# Altium schematic symbol library IC_TI.SCHLIB: 1162 symbols (part 6 of 8) (continued)
## SN74LVC245ADWR (continued)
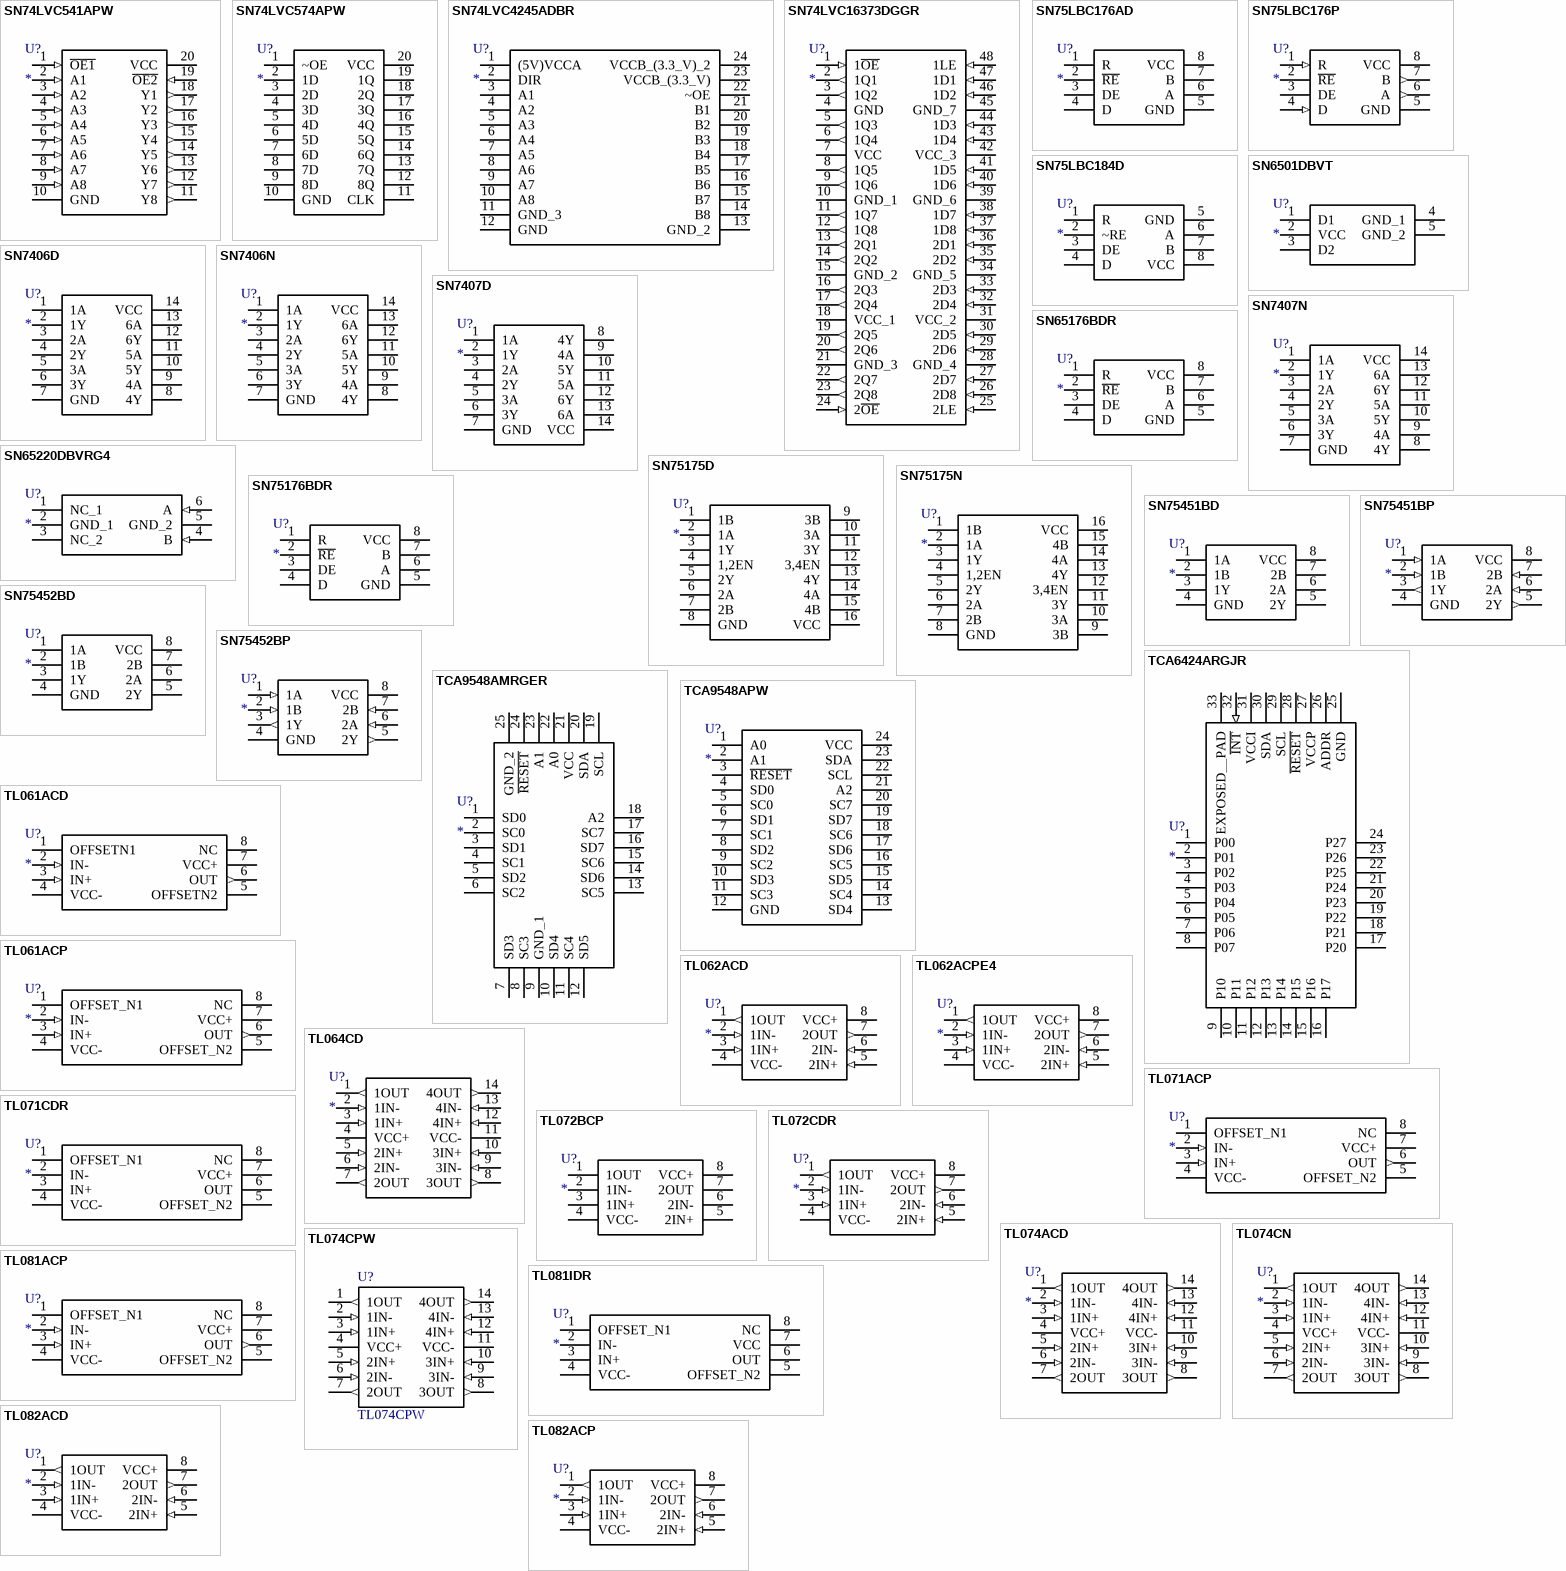
[diagram p25: symbols SN74LVC541APW to TL082ACP]

## SN74LVC541APW
designator U?
Integrated Circuit; Manufacturer_Name: Texas Instruments; Manufacturer_Part_Number: SN74LVC541APW; Datasheet Link: http://www.ti.com/lit/ds/symlink/sn74lvc541a.pdf; Height: 1.2mm; Mouser Part Number: 595-SN74LVC541APW; Mouser Price/Stock: https://www.mouser.com/Search/Refine.aspx?Keyword=595-SN74LVC541APW; RS Part Number: 1791611; RS Price/Stock: http://uk.rs-online.com/web/p/products/1791611
footprint TSSOP20_0.65 (TSOP, 20-Leads, Body 6.6x4.5mm (max), Pitch 0.65mm, IPC Medium Density)
pins: 1 ~{OE1} (in), 2 A1 (in), 3 A2 (in), 4 A3 (in), 5 A4 (in), 6 A5 (in), 7 A6 (in), 8 A7 (in), 9 A8 (in), 10 GND (power), 11 Y8 (out), 12 Y7 (out), 13 Y6 (out), 14 Y5 (out), 15 Y4 (out), 16 Y3 (out), 17 Y2 (out), 18 Y1 (out), 19 ~{OE2} (in), 20 VCC (power)

## SN74LVC574APW
designator U?
Integrated Circuit; Manufacturer_Name: Texas Instruments; Manufacturer_Part_Number: SN74LVC574APW; Mouser Part Number: 595-SN74LVC574APW; Mouser Price/Stock: https://www.mouser.com/Search/Refine.aspx?Keyword=595-SN74LVC574APW
footprint TSSOP20_0.65 (TSOP, 20-Leads, Body 6.6x4.5mm (max), Pitch 0.65mm, IPC Medium Density)
pins: 1 ~OE, 2 1D, 3 2D, 4 3D, 5 4D, 6 5D, 7 6D, 8 7D, 9 8D, 10 GND, 11 CLK, 12 8Q, 13 7Q, 14 6Q, 15 5Q, 16 4Q, 17 3Q, 18 2Q, 19 1Q, 20 VCC

## SN74LVC4245ADBR
designator U?
Integrated Circuit; Manufacturer_Name: Texas Instruments; Manufacturer_Part_Number: SN74LVC4245ADBR; Datasheet Link: http://www.ti.com/lit/gpn/sn74lvc4245a; Mouser Part Number: 595-SN74LVC4245ADBR; Mouser Price/Stock: https://www.mouser.com/Search/Refine.aspx?Keyword=595-SN74LVC4245ADBR; RS Part Number: 1627513; RS Price/Stock: http://uk.rs-online.com/web/p/products/1627513
footprint TSSOP24W_0.65 (TSOP, 24-Leads, Body 7.80x4.40mm, Pitch 0.65mm, Thermal Pad 5.16x2.40mm, IPC Low Density)
pins: 1 (5V)VCCA, 2 DIR, 3 A1, 4 A2, 5 A3, 6 A4, 7 A5, 8 A6, 9 A7, 10 A8, 11 GND_3, 12 GND, 13 GND_2, 14 B8, 15 B7, 16 B6, 17 B5, 18 B4, 19 B3, 20 B2, 21 B1, 22 ~OE, 23 VCCB_(3.3_V), 24 VCCB_(3.3_V)_2

## SN74LVC16373DGGR
designator U?
Integrated Circuit; Manufacturer_Name: Texas Instruments; Manufacturer_Part_Number: SN74LVC16373DGGR; Datasheet Link: http://www.ti.com/lit/ds/symlink/sn74lvc16373.pdf; Height: 1.2mm; Mouser Part Number: 595-SN74LVC16373DGGR; RS Part Number: 6628667; RS Price/Stock: http://uk.rs-online.com/web/p/products/6628667
footprint SSOP48_0.65
pins: 1 1~{OE} (in), 2 1Q1 (out), 3 1Q2 (out), 4 GND (power), 5 1Q3 (out), 6 1Q4 (out), 7 VCC (power), 8 1Q5 (out), 9 1Q6 (out), 10 GND_1 (power), 11 1Q7 (out), 12 1Q8 (out), 13 2Q1 (out), 14 2Q2 (out), 15 GND_2 (power), 16 2Q3 (out), 17 2Q4 (out), 18 VCC_1 (power), 19 2Q5 (out), 20 2Q6 (out), 21 GND_3 (power), 22 2Q7 (out), 23 2Q8 (out), 24 2~{OE} (in), 25 2LE (in), 26 2D8 (in), 27 2D7 (in), 28 GND_4 (power), 29 2D6 (in), 30 2D5 (in), 31 VCC_2 (power), 32 2D4 (in), 33 2D3 (in), 34 GND_5 (power), 35 2D2 (in), 36 2D1 (in), 37 1D8 (in), 38 1D7 (in), 39 GND_6 (power), 40 1D6 (in), 41 1D5 (in), 42 VCC_3 (power), 43 1D4 (in), 44 1D3 (in), 45 GND_7 (power), 46 1D2 (in), 47 1D1 (in), 48 1LE (in)

## SN75LBC176AD
designator U?
Integrated Circuit; Manufacturer_Name: Texas Instruments; Manufacturer_Part_Number: SN75LBC176AD; Datasheet Link: http://www.ti.com/lit/ds/symlink/sn75lbc176a.pdf; Height: 1.75mm; Mouser Part Number: 595-SN75LBC176AD; Mouser Price/Stock: https://www.mouser.com/Search/Refine.aspx?Keyword=595-SN75LBC176AD; RS Part Number: 1218658; RS Price/Stock: http://uk.rs-online.com/web/p/products/1218658
footprint SOIC8_1.27 (SOP, 8-Leads, Pitch 1.27mm)
pins: 1 R, 2 ~{RE}, 3 DE, 4 D, 5 GND (power), 6 A, 7 B, 8 VCC (power)

## SN75LBC176P
designator U?
Integrated Circuit; Manufacturer_Name: Texas Instruments; Manufacturer_Part_Number: SN75LBC176P; Datasheet Link: http://www.ti.com/lit/ds/symlink/sn75lbc176.pdf; Height: 5.08mm; Mouser Part Number: 595-SN75LBC176P; Mouser Price/Stock: https://www.mouser.com/Search/Refine.aspx?Keyword=595-SN75LBC176P; RS Part Number: 1892333P; RS Price/Stock: http://uk.rs-online.com/web/p/products/1892333P
footprint DIP8-A
pins: 1 R (in), 2 ~{RE}, 3 DE, 4 D (in), 5 GND (power), 6 A (out), 7 B (out), 8 VCC (power)

## SN75LBC184D
designator U?
Integrated Circuit; Manufacturer_Name: Texas Instruments; Manufacturer_Part_Number: SN75LBC184D; Datasheet Link: http://www.ti.com/lit/gpn/sn75lbc184; Mouser Part Number: 595-SN75LBC184D; Mouser Price/Stock: https://www.mouser.com/Search/Refine.aspx?Keyword=595-SN75LBC184D; RS Part Number: 1218420; RS Price/Stock: http://uk.rs-online.com/web/p/products/1218420
footprint SOIC8_1.27 (SOP, 8-Leads, Pitch 1.27mm)
pins: 1 R, 2 ~RE, 3 DE, 4 D, 5 GND, 6 A, 7 B, 8 VCC

## SN6501DBVT
designator U?
Integrated Circuit; Manufacturer_Name: Texas Instruments; Manufacturer_Part_Number: SN6501DBVT; Datasheet Link: http://www.ti.com/lit/gpn/sn6501; Height: 1.45mm; Mouser Part Number: 595-SN6501DBVT; Mouser Price/Stock: https://www.mouser.com/Search/Refine.aspx?Keyword=595-SN6501DBVT; RS Part Number: 9222313; RS Price/Stock: http://uk.rs-online.com/web/p/products/9222313
footprint SOT23-5 (SOT23, 5-Leads, Body 3.0x3.0mm (max), Pitch 0.95mm, IPC Medium Density)
pins: 1 D1, 2 VCC, 3 D2, 4 GND_1, 5 GND_2

## SN7406D
designator U?
Integrated Circuit; Manufacturer_Name: Texas Instruments; Manufacturer_Part_Number: SN7406D; Datasheet Link: http://www.ti.com/lit/ds/symlink/sn7406.pdf; Height: 1.75mm; Mouser Part Number: 595-SN7406D; Mouser Price/Stock: https://www.mouser.com/Search/Refine.aspx?Keyword=595-SN7406D; RS Part Number: 6630739P; RS Price/Stock: http://uk.rs-online.com/web/p/products/6630739P
footprint SOIC14_1.27
pins: 1 1A, 2 1Y, 3 2A, 4 2Y, 5 3A, 6 3Y, 7 GND (power), 8 4Y, 9 4A, 10 5Y, 11 5A, 12 6Y, 13 6A, 14 VCC (power)

## SN7406N
designator U?
Integrated Circuit; Manufacturer_Name: Texas Instruments; Manufacturer_Part_Number: SN7406N; Datasheet Link: http://www.ti.com/lit/gpn/sn7406; Mouser Part Number: 595-SN7406N; Mouser Price/Stock: https://www.mouser.com/Search/Refine.aspx?Keyword=595-SN7406N; RS Part Number: 0306320P; RS Price/Stock: http://uk.rs-online.com/web/p/products/0306320P
footprint DIP14
pins: 1 1A, 2 1Y, 3 2A, 4 2Y, 5 3A, 6 3Y, 7 GND, 8 4Y, 9 4A, 10 5Y, 11 5A, 12 6Y, 13 6A, 14 VCC

## SN7407D
designator U?
Integrated Circuit; Manufacturer_Name: Texas Instruments; Manufacturer_Part_Number: SN7407D; Datasheet Link: http://componentsearchengine.com/Datasheets/1/SN7407D.pdf; Mouser Part Number: 595-SN7407D; Mouser Price/Stock: https://www.mouser.com/Search/Refine.aspx?Keyword=595-SN7407D; RS Part Number: 2508243277; RS Price/Stock: http://uk.rs-online.com/web/p/products/2508243277
footprint SOIC14_1.27
pins: 1 1A, 2 1Y, 3 2A, 4 2Y, 5 3A, 6 3Y, 7 GND, 8 4Y, 9 4A, 10 5Y, 11 5A, 12 6Y, 13 6A, 14 VCC

## SN7407N
designator U?
Integrated Circuit; Manufacturer_Name: Texas Instruments; Manufacturer_Part_Number: SN7407N; Datasheet Link: http://www.ti.com/lit/gpn/sn7407; Mouser Part Number: 595-SN7407N; Mouser Price/Stock: https://www.mouser.com/Search/Refine.aspx?Keyword=595-SN7407N; RS Part Number: 3685610; RS Price/Stock: http://uk.rs-online.com/web/p/products/3685610
footprint DIP14
pins: 1 1A, 2 1Y, 3 2A, 4 2Y, 5 3A, 6 3Y, 7 GND, 8 4Y, 9 4A, 10 5Y, 11 5A, 12 6Y, 13 6A, 14 VCC

## SN65176BDR
designator U?
Integrated Circuit; Manufacturer_Name: Texas Instruments; Manufacturer_Part_Number: SN65176BDR; Datasheet Link: http://www.ti.com/lit/ds/symlink/sn65176b.pdf; Height: 1.75mm; Mouser Part Number: 595-SN65176BDR; Mouser Price/Stock: https://www.mouser.com/Search/Refine.aspx?Keyword=595-SN65176BDR; RS Part Number: 0528539; RS Price/Stock: http://uk.rs-online.com/web/p/products/0528539
footprint SOIC8_1.27 (SOP, 8-Leads, Pitch 1.27mm)
pins: 1 R, 2 ~{RE}, 3 DE, 4 D, 5 GND (power), 6 A, 7 B, 8 VCC (power)

## SN65220DBVRG4
designator U?
Integrated Circuit; Manufacturer_Name: Texas Instruments; Manufacturer_Part_Number: SN65220DBVRG4; Datasheet Link: http://www.ti.com/lit/ds/symlink/sn75240.pdf; Height: 1.45mm; Mouser Part Number: 595-SN65220DBVRG4; Mouser Price/Stock: https://www.mouser.com/Search/Refine.aspx?Keyword=595-SN65220DBVRG4
footprint SOT23-6
pins: 1 NC_1, 2 GND_1 (power), 3 NC_2, 4 B (in), 5 GND_2 (power), 6 A (in)

## SN75175D
designator U?
Integrated Circuit; Manufacturer_Name: Texas Instruments; Manufacturer_Part_Number: SN75175D; Datasheet Link: http://www.ti.com/lit/gpn/sn75175; Mouser Part Number: 595-SN75175D; Mouser Price/Stock: https://www.mouser.com/Search/Refine.aspx?Keyword=595-SN75175D; RS Part Number: 1451020; RS Price/Stock: http://uk.rs-online.com/web/p/products/1451020
footprint SOIC16_1.27
pins: 1 1B, 2 1A, 3 1Y, 4 1,2EN, 5 2Y, 6 2A, 7 2B, 8 GND, 9 3B, 10 3A, 11 3Y, 12 3,4EN, 13 4Y, 14 4A, 15 4B, 16 VCC

## SN75175N
designator U?
Integrated Circuit; Manufacturer_Name: Texas Instruments; Manufacturer_Part_Number: SN75175N; Datasheet Link: http://www.ti.com/lit/gpn/sn75175; Mouser Part Number: 595-SN75175N; Mouser Price/Stock: https://www.mouser.com/Search/Refine.aspx?Keyword=595-SN75175N; RS Part Number: 0630904; RS Price/Stock: http://uk.rs-online.com/web/p/products/0630904
footprint DIP16
pins: 1 1B, 2 1A, 3 1Y, 4 1,2EN, 5 2Y, 6 2A, 7 2B, 8 GND, 9 3B, 10 3A, 11 3Y, 12 3,4EN, 13 4Y, 14 4A, 15 4B, 16 VCC

## SN75176BDR
designator U?
Integrated Circuit; Manufacturer_Name: Texas Instruments; Manufacturer_Part_Number: SN75176BDR; Datasheet Link: http://www.ti.com/lit/ds/symlink/sn75176b.pdf; Height: 1.75mm; Mouser Part Number: 595-SN75176BDR; Mouser Price/Stock: https://www.mouser.com/Search/Refine.aspx?Keyword=595-SN75176BDR; RS Part Number: 0526391; RS Price/Stock: http://uk.rs-online.com/web/p/products/0526391
footprint SOIC8_1.27 (SOP, 8-Leads, Pitch 1.27mm)
pins: 1 R, 2 ~{RE}, 3 DE, 4 D, 5 GND (power), 6 A, 7 B, 8 VCC (power)

## SN75451BD
designator U?
Integrated Circuit; Manufacturer_Name: Texas Instruments; Manufacturer_Part_Number: SN75451BD; Datasheet Link: http://www.ti.com/lit/ds/symlink/sn75451b.pdf; Height: 1.75mm; Mouser Part Number: 595-SN75451BD; Mouser Price/Stock: https://www.mouser.com/Search/Refine.aspx?Keyword=595-SN75451BD; RS Part Number: 0857783P; RS Price/Stock: http://uk.rs-online.com/web/p/products/0857783P
footprint SOIC8_1.27 (SOP, 8-Leads, Pitch 1.27mm)
pins: 1 1A, 2 1B, 3 1Y, 4 GND (power), 5 2Y, 6 2A, 7 2B, 8 VCC (power)

## SN75451BP
designator U?
Integrated Circuit; Manufacturer_Name: Texas Instruments; Manufacturer_Part_Number: SN75451BP; Datasheet Link: http://docs-emea.rs-online.com/webdocs/13d2/0900766b813d278b.pdf; Height: 5.08mm; Mouser Part Number: 595-SN75451BP; Mouser Price/Stock: https://www.mouser.com/Search/Refine.aspx?Keyword=595-SN75451BP; RS Part Number: 0649295; RS Price/Stock: http://uk.rs-online.com/web/p/products/0649295
footprint DIP8-A
pins: 1 1A (in), 2 1B (in), 3 1Y (out), 4 GND (power), 5 2Y (out), 6 2A (in), 7 2B (in), 8 VCC (power)

## SN75452BD
designator U?
Integrated Circuit; Manufacturer_Name: Texas Instruments; Manufacturer_Part_Number: SN75452BD; Datasheet Link: http://www.ti.com/lit/ds/symlink/sn75451b.pdf; Height: 1.75mm; Mouser Part Number: 595-SN75452BD; Mouser Price/Stock: https://www.mouser.com/Search/Refine.aspx?Keyword=595-SN75452BD; RS Part Number: 0857799; RS Price/Stock: http://uk.rs-online.com/web/p/products/0857799
footprint SOIC8_1.27 (SOP, 8-Leads, Pitch 1.27mm)
pins: 1 1A, 2 1B, 3 1Y, 4 GND (power), 5 2Y, 6 2A, 7 2B, 8 VCC (power)

## SN75452BP
designator U?
Integrated Circuit; Manufacturer_Name: Texas Instruments; Manufacturer_Part_Number: SN75452BP; Datasheet Link: http://docs-emea.rs-online.com/webdocs/13d2/0900766b813d278b.pdf; Height: 5.08mm; Mouser Part Number: 595-SN75452BP; Mouser Price/Stock: https://www.mouser.com/Search/Refine.aspx?Keyword=595-SN75452BP; RS Part Number: 1218457; RS Price/Stock: http://uk.rs-online.com/web/p/products/1218457
footprint DIP8-A
pins: 1 1A (in), 2 1B (in), 3 1Y (out), 4 GND (power), 5 2Y (out), 6 2A (in), 7 2B (in), 8 VCC (power)

## TCA6424ARGJR
designator U?
Integrated Circuit; Manufacturer_Name: Texas Instruments; Manufacturer_Part_Number: TCA6424ARGJR; Datasheet Link: http://www.ti.com/lit/ds/symlink/tca6424a.pdf; Height: 0.6mm; Mouser Part Number: 595-TCA6424ARGJR; Mouser Price/Stock: https://www.mouser.com/Search/Refine.aspx?Keyword=595-TCA6424ARGJR; RS Part Number: 1626407; RS Price/Stock: http://uk.rs-online.com/web/p/products/1626407
footprint QFN32_0.5-PAD(5X5) (QFN, 32-Leads, Body 5.2x5.2mm (max), Pitch 0.50mm, IPC Medium Density)
pins: 1 P00, 2 P01, 3 P02, 4 P03, 5 P04, 6 P05, 7 P06, 8 P07, 9 P10, 10 P11, 11 P12, 12 P13, 13 P14, 14 P15, 15 P16, 16 P17, 17 P20, 18 P21, 19 P22, 20 P23, 21 P24, 22 P25, 23 P26, 24 P27, 25 GND (power), 26 ADDR, 27 VCCP (power), 28 ~{RESET}, 29 SCL, 30 SDA, 31 VCCI (power), 32 ~{INT} (in), 33 EXPOSED__PAD

## TCA9548AMRGER
designator U?
Integrated Circuit; Manufacturer_Name: Texas Instruments; Manufacturer_Part_Number: TCA9548AMRGER; Datasheet Link: http://www.ti.com/lit/gpn/tca9548a; Height: 1mm; Mouser Part Number: 595-TCA9548AMRGER; Mouser Price/Stock: https://www.mouser.com/Search/Refine.aspx?Keyword=595-TCA9548AMRGER
footprint QFN24_0.5-PAD(4X4) (QFN, 24-Leads, Body 4.1x4.1mm (max), Pitch 0.50mm, IPC Medium Density)
pins: 1 SD0, 2 SC0, 3 SD1, 4 SC1, 5 SD2, 6 SC2, 7 SD3, 8 SC3, 9 GND_1 (power), 10 SD4, 11 SC4, 12 SD5, 13 SC5, 14 SD6, 15 SC6, 16 SD7, 17 SC7, 18 A2, 19 SCL, 20 SDA, 21 VCC (power), 22 A0, 23 A1, 24 ~{RESET}, 25 GND_2

## TCA9548APW
designator U?
Integrated Circuit; Manufacturer_Name: Texas Instruments; Manufacturer_Part_Number: TCA9548APW; Datasheet Link: http://www.ti.com/lit/ds/symlink/tca9548a.pdf; Height: 1.2mm
footprint TSSOP24_0.65 (TSOP, 24-Leads, Body 7.80x4.40mm, Pitch 0.65mm, Thermal Pad 5.16x2.40mm, IPC Low Density)
pins: 1 A0, 2 A1, 3 ~{RESET}, 4 SD0, 5 SC0, 6 SD1, 7 SC1, 8 SD2, 9 SC2, 10 SD3, 11 SC3, 12 GND, 13 SD4, 14 SC4, 15 SD5, 16 SC5, 17 SD6, 18 SC6, 19 SD7, 20 SC7, 21 A2, 22 SCL, 23 SDA, 24 VCC

## TL061ACD
designator U?
Integrated Circuit; Manufacturer_Name: Texas Instruments; Manufacturer_Part_Number: TL061ACD; Datasheet Link: http://www.ti.com/lit/ds/symlink/tl061a.pdf; Height: 1.75mm; Mouser Part Number: 595-TL061ACD; Mouser Price/Stock: https://www.mouser.com/Search/Refine.aspx?Keyword=595-TL061ACD; RS Part Number: 1450408; RS Price/Stock: http://uk.rs-online.com/web/p/products/1450408
footprint SOIC8_1.27 (SOP, 8-Leads, Pitch 1.27mm)
pins: 1 OFFSETN1, 2 IN- (in), 3 IN+ (in), 4 VCC- (power), 5 OFFSETN2, 6 OUT (out), 7 VCC+ (power), 8 NC

## TL061ACP
designator U?
Integrated Circuit; Manufacturer_Name: Texas Instruments; Manufacturer_Part_Number: TL061ACP; Datasheet Link: http://www.ti.com/lit/ds/symlink/tl061a.pdf; Height: 5.08mm; Mouser Part Number: 595-TL061ACP; Mouser Price/Stock: https://www.mouser.com/Search/Refine.aspx?Keyword=595-TL061ACP; RS Part Number: 1456107; RS Price/Stock: http://uk.rs-online.com/web/p/products/1456107
footprint DIP8-A
pins: 1 OFFSET_N1, 2 IN- (in), 3 IN+ (in), 4 VCC- (power), 5 OFFSET_N2, 6 OUT (out), 7 VCC+ (power), 8 NC

## TL062ACD
designator U?
Integrated Circuit; Manufacturer_Name: Texas Instruments; Manufacturer_Part_Number: TL062ACD; Datasheet Link: http://www.ti.com/lit/ds/symlink/tl061a.pdf; Height: 1.75mm; RS Part Number: 2508248351; RS Price/Stock: http://uk.rs-online.com/web/p/products/2508248351
footprint SOIC8_1.27 (SOP, 8-Leads, Pitch 1.27mm)
pins: 1 1OUT (out), 2 1IN- (in), 3 1IN+ (in), 4 VCC- (power), 5 2IN+ (in), 6 2IN- (in), 7 2OUT (out), 8 VCC+ (power)

## TL062ACPE4
designator U?
Integrated Circuit; Manufacturer_Name: Texas Instruments; Manufacturer_Part_Number: TL062ACPE4; Datasheet Link: http://www.ti.com/lit/ds/symlink/tl061a.pdf; Height: 5.08mm; RS Part Number: 7092176P; RS Price/Stock: http://uk.rs-online.com/web/p/products/7092176P
footprint DIP8-A
pins: 1 1OUT (out), 2 1IN- (in), 3 1IN+ (in), 4 VCC- (power), 5 2IN+ (in), 6 2IN- (in), 7 2OUT (out), 8 VCC+ (power)

## TL064CD
designator U?
Integrated Circuit; Manufacturer_Name: Texas Instruments; Manufacturer_Part_Number: TL064CD; Datasheet Link: http://www.ti.com/lit/ds/symlink/tl061.pdf; Height: 1.75mm; Mouser Part Number: 595-TL064CD; Mouser Price/Stock: https://www.mouser.com/Search/Refine.aspx?Keyword=595-TL064CD; RS Part Number: 0857884P; RS Price/Stock: http://uk.rs-online.com/web/p/products/0857884P
footprint SOIC14_1.27
pins: 1 1OUT (out), 2 1IN- (in), 3 1IN+ (in), 4 VCC+ (power), 5 2IN+ (in), 6 2IN- (in), 7 2OUT (out), 8 3OUT (out), 9 3IN- (in), 10 3IN+ (in), 11 VCC- (power), 12 4IN+ (in), 13 4IN- (in), 14 4OUT (out)

## TL071ACP
designator U?
Integrated Circuit; Manufacturer_Name: Texas Instruments; Manufacturer_Part_Number: TL071ACP; Datasheet Link: http://www.ti.com/lit/ds/symlink/tl071a.pdf; Height: 5.08mm; Mouser Part Number: 595-TL071ACP; Mouser Price/Stock: https://www.mouser.com/Search/Refine.aspx?Keyword=595-TL071ACP; RS Part Number: 1450388; RS Price/Stock: http://uk.rs-online.com/web/p/products/1450388
footprint DIP8-A
pins: 1 OFFSET_N1, 2 IN- (in), 3 IN+ (in), 4 VCC- (power), 5 OFFSET_N2, 6 OUT (out), 7 VCC+ (power), 8 NC

## TL071CDR
designator U?
Integrated Circuit; Manufacturer_Name: Texas Instruments; Manufacturer_Part_Number: TL071CDR; Datasheet Link: http://www.ti.com/lit/gpn/tl071; Height: 1.75mm; Mouser Part Number: 595-TL071CDR; Mouser Price/Stock: https://www.mouser.com/Search/Refine.aspx?Keyword=595-TL071CDR; RS Part Number: 1791697; RS Price/Stock: http://uk.rs-online.com/web/p/products/1791697
footprint SOIC8_1.27 (SOP, 8-Leads, Pitch 1.27mm)
pins: 1 OFFSET_N1, 2 IN-, 3 IN+, 4 VCC-, 5 OFFSET_N2, 6 OUT, 7 VCC+, 8 NC

## TL072BCP
designator U?
Integrated Circuit; Manufacturer_Name: Texas Instruments; Manufacturer_Part_Number: TL072BCP; Datasheet Link: http://www.ti.com/lit/ds/symlink/tl072b.pdf; Height: 5.08mm; Mouser Part Number: 595-TL072BCP; Mouser Price/Stock: https://www.mouser.com/Search/Refine.aspx?Keyword=595-TL072BCP; RS Part Number: 2508715261; RS Price/Stock: http://uk.rs-online.com/web/p/products/2508715261
footprint DIP8-A
pins: 1 1OUT, 2 1IN-, 3 1IN+, 4 VCC-, 5 2IN+, 6 2IN-, 7 2OUT, 8 VCC+

## TL072CDR
designator U?
Integrated Circuit; Manufacturer_Name: Texas Instruments; Manufacturer_Part_Number: TL072CDR; Datasheet Link: http://www.ti.com/lit/ds/symlink/tl072.pdf; Height: 1.75mm; Mouser Part Number: 595-TL072CDR; Mouser Price/Stock: https://www.mouser.com/Search/Refine.aspx?Keyword=595-TL072CDR; RS Part Number: 1695560; RS Price/Stock: http://uk.rs-online.com/web/p/products/1695560
footprint SOIC8_1.27 (SOP, 8-Leads, Pitch 1.27mm)
pins: 1 1OUT (out), 2 1IN- (in), 3 1IN+ (in), 4 VCC- (power), 5 2IN+ (in), 6 2IN- (in), 7 2OUT (out), 8 VCC+ (power)

## TL074ACD
designator U?
Integrated Circuit; Manufacturer_Name: Texas Instruments; Manufacturer_Part_Number: TL074ACD; Datasheet Link: http://www.ti.com/lit/ds/symlink/tl071.pdf; Height: 1.75mm; Mouser Part Number: 595-TL074ACD; Mouser Price/Stock: https://www.mouser.com/Search/Refine.aspx?Keyword=595-TL074ACD; RS Part Number: 1457304; RS Price/Stock: http://uk.rs-online.com/web/p/products/1457304
footprint SOIC14_1.27
pins: 1 1OUT (out), 2 1IN- (in), 3 1IN+ (in), 4 VCC+ (power), 5 2IN+ (in), 6 2IN- (in), 7 2OUT (out), 8 3OUT (out), 9 3IN- (in), 10 3IN+ (in), 11 VCC- (power), 12 4IN+ (in), 13 4IN- (in), 14 4OUT (out)

## TL074CN
designator U?
Integrated Circuit; Manufacturer_Name: Texas Instruments; Manufacturer_Part_Number: TL074CN; Datasheet Link: http://uk.rs-online.com/web/p/products/0302621; Height: 5.08mm; Mouser Part Number: 595-TL074CN; Mouser Price/Stock: https://www.mouser.com/Search/Refine.aspx?Keyword=595-TL074CN; RS Part Number: 0302621P; RS Price/Stock: http://uk.rs-online.com/web/p/products/0302621P
footprint DIP14-A
pins: 1 1OUT (out), 2 1IN- (in), 3 1IN+ (in), 4 VCC+ (power), 5 2IN+ (in), 6 2IN- (in), 7 2OUT (out), 8 3OUT (out), 9 3IN- (in), 10 3IN+ (in), 11 VCC- (power), 12 4IN+ (in), 13 4IN- (in), 14 4OUT (out)

## TL074CPW
designator U?
Integrated Circuit; Manufacturer_Name: Texas Instruments; Datasheet Link: http://www.ti.com/lit/ds/symlink/tl071a.pdf; Height: 1.2mm; Manufacturer_Part_Number: TL074CPW; Mouser Part Number: 595-TL074CPW; Mouser Price/Stock: https://www.mouser.com/Search/Refine.aspx?Keyword=595-TL074CPW; RS Part Number: 1625541; RS Price/Stock: http://uk.rs-online.com/web/p/products/1625541
footprint TSSOP14_0.65 (TSOP, 14-Leads, Body 5.00x4.40mm, Pitch 0.65mm, Thermal Pad 2.31x2.46mm, IPC Low Density)
pins: 1 1OUT (out), 2 1IN- (in), 3 1IN+ (in), 4 VCC+ (power), 5 2IN+ (in), 6 2IN- (in), 7 2OUT (out), 8 3OUT (out), 9 3IN- (in), 10 3IN+ (in), 11 VCC- (power), 12 4IN+ (in), 13 4IN- (in), 14 4OUT (out)

## TL081ACP
designator U?
Integrated Circuit; Manufacturer_Name: Texas Instruments; Manufacturer_Part_Number: TL081ACP; Datasheet Link: http://www.ti.com/lit/ds/symlink/tl081a.pdf; Height: 5.08mm; Mouser Part Number: 595-TL081ACP; Mouser Price/Stock: https://www.mouser.com/Search/Refine.aspx?Keyword=595-TL081ACP
footprint DIP8-A
pins: 1 OFFSET_N1, 2 IN- (in), 3 IN+ (in), 4 VCC- (power), 5 OFFSET_N2, 6 OUT (out), 7 VCC+ (power), 8 NC

## TL081IDR
designator U?
Integrated Circuit; Manufacturer_Name: Texas Instruments; Manufacturer_Part_Number: TL081IDR; Datasheet Link: http://www.ti.com/lit/gpn/tl081; Height: 1.75mm; Mouser Part Number: 595-TL081IDR; Mouser Price/Stock: https://www.mouser.com/Search/Refine.aspx?Keyword=595-TL081IDR; RS Part Number: 6610088P; RS Price/Stock: http://uk.rs-online.com/web/p/products/6610088P
footprint SOIC8_1.27 (SOP, 8-Leads, Pitch 1.27mm)
pins: 1 OFFSET_N1, 2 IN-, 3 IN+, 4 VCC-, 5 OFFSET_N2, 6 OUT, 7 VCC, 8 NC

## TL082ACD
designator U?
Integrated Circuit; Manufacturer_Name: Texas Instruments; Manufacturer_Part_Number: TL082ACD; Datasheet Link: http://www.ti.com/lit/ds/symlink/tl082a.pdf; Height: 1.75mm; Mouser Part Number: 595-TL082ACD; Mouser Price/Stock: https://www.mouser.com/Search/Refine.aspx?Keyword=595-TL082ACD; RS Part Number: 2508248547; RS Price/Stock: http://china.rs-online.com/web/p/products/2508248547
footprint SOIC8_1.27 (SOP, 8-Leads, Pitch 1.27mm)
pins: 1 1OUT (out), 2 1IN- (in), 3 1IN+ (in), 4 VCC- (power), 5 2IN+ (in), 6 2IN- (in), 7 2OUT (out), 8 VCC+ (power)

## TL082ACP
designator U?
Integrated Circuit; Manufacturer_Name: Texas Instruments; Manufacturer_Part_Number: TL082ACP; Datasheet Link: http://www.ti.com/lit/ds/symlink/tl081a.pdf; Height: 5.08mm; Mouser Part Number: 595-TL082ACP; Mouser Price/Stock: https://www.mouser.com/Search/Refine.aspx?Keyword=595-TL082ACP; RS Part Number: 1218490; RS Price/Stock: http://uk.rs-online.com/web/p/products/1218490
footprint DIP8-A
pins: 1 1OUT (out), 2 1IN- (in), 3 1IN+ (in), 4 VCC- (power), 5 2IN+ (in), 6 2IN- (in), 7 2OUT (out), 8 VCC+ (power)
